# Altium footprint library hphonglib.PcbLib: 1250 footprints (part 42 of 79)
Each footprint in its own frame and in the unit in brackets; x right, y up, seen from the top. Pads: shape width x height; smd on the part's side, far side on the other; paste and mask are expansions set on the pad; w line width, h text height; cw(c..) or ccw(c..) is an arc to the next point about the centre after c.
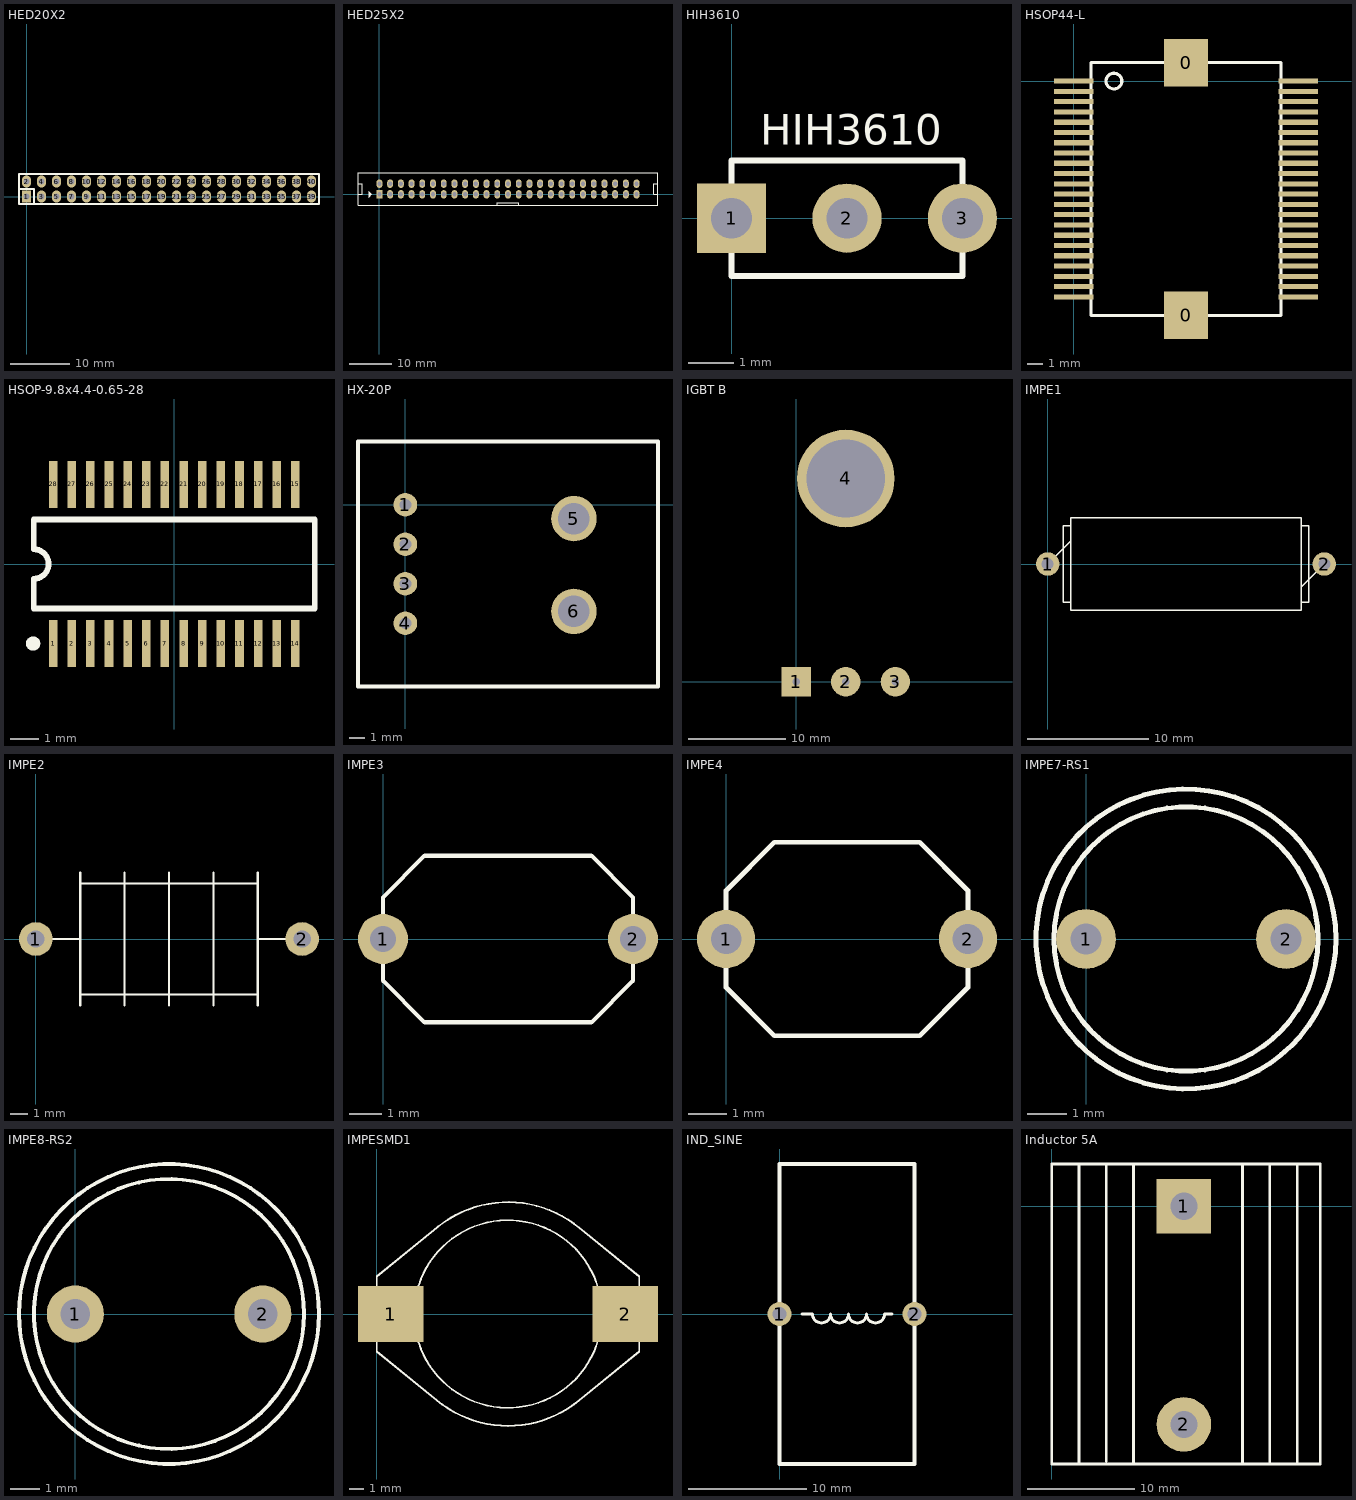
[diagram p41: the footprints below, top view; thin cyan lines are the x and y axes]

## HED20X2 [mm]
pads (40):
  rect 1.6x2 hole 1: 1(0,0)
  oval 1.6x2 hole 1: 2(0,2.54) 3(2.54,0) 4(2.54,2.54) 5(5.08,0) 6(5.08,2.54) 7(7.62,0) 8(7.62,2.54) 9(10.16,0) 10(10.16,2.54) 11(12.7,0) 12(12.7,2.54) 13(15.24,0) 14(15.24,2.54) 15(17.78,0) 16(17.78,2.54) 17(20.32,0) 18(20.32,2.54) 19(22.86,0) 20(22.86,2.54) 21(25.4,0) 22(25.4,2.54) 23(27.94,0) 24(27.94,2.54) 25(30.48,0) 26(30.48,2.54) 27(33.02,0) 28(33.02,2.54) 29(35.56,0) 30(35.56,2.54) 31(38.1,0) 32(38.1,2.54) 33(40.64,0) 34(40.64,2.54) 35(43.18,0) 36(43.18,2.54) 37(45.72,0) 38(45.72,2.54) 39(48.26,0) 40(48.26,2.54)
Top Overlay:
  lines w0.305: -1.27,1.27 1.27,1.27 1.27,-1.27 ; -1.27,-1.27 -1.27,3.81 49.53,3.81 49.53,-1.27 -1.27,-1.27

## HED25X2 [mm]
pads (50):
  rect 1.4x2 hole 1: 1(0,0)
  oval 1.4x2 hole 1: 2(0,2.54) 3(2.54,0) 4(2.54,2.54) 5(5.08,0) 6(5.08,2.54) 7(7.62,0) 8(7.62,2.54) 9(10.16,0) 10(10.16,2.54) 11(12.7,0) 12(12.7,2.54) 13(15.24,0) 14(15.24,2.54) 15(17.78,0) 16(17.78,2.54) 17(20.32,0) 18(20.32,2.54) 19(22.86,0) 20(22.86,2.54) 21(25.4,0) 22(25.4,2.54) 23(27.94,0) 24(27.94,2.54) 25(30.48,0) 26(30.48,2.54) 27(33.02,0) 28(33.02,2.54) 29(35.56,0) 30(35.56,2.54) 31(38.1,0) 32(38.1,2.54) 33(40.64,0) 34(40.64,2.54) 35(43.18,0) 36(43.18,2.54) 37(45.72,0) 38(45.72,2.54) 39(48.26,0) 40(48.26,2.54) 41(50.8,0) 42(50.8,2.54) 43(53.34,0) 44(53.34,2.54) 45(55.88,0) 46(55.88,2.54) 47(58.42,0) 48(58.42,2.54) 49(60.96,0) 50(60.96,2.54)
Top Overlay:
  region: -2.565,0.749 -2.565,-0.8 -1.778,-0.013
  lines w0.203: -5.055,0.025 -4.089,0.025 -4.089,2.54 -5.055,2.54 ; 27.915,-2.489 27.915,-2.032 33.02,-2.032 33.045,-2.007 33.045,-2.54 ; 66.015,5.08 -5.08,5.08 -5.08,-2.54 66.04,-2.54 66.04,-2.515 66.04,5.08 ; 66.04,0.025 65.075,0.025 65.075,2.54 66.04,2.54

## HIH3610 [mil]
pads (3):
  rect 60x60 hole 35.43: 1(0,0)
  round 60 hole 35.43: 2(100,0) 3(200,0)
Top Overlay:
  lines w5: 0,-50 200,-50 200,50 0,50 0,-50
  text "HIH3610" at 25,55 h45.6

## HSOP44-L [mm]
pads (46):
  rect 2.8x3 smd: 0(7.1,-14.815) 0(7.1,1.162)
  rect 2.5x0.325 smd: 1(0,0) 2(0,-0.65) 3(0,-1.3) 4(0,-1.95) 5(0,-2.6) 6(0,-3.25) 7(0,-3.9) 8(0,-4.55) 9(0,-5.2) 10(0,-5.85) 11(0,-6.5) 12(0,-7.15) 13(0,-7.8) 14(0,-8.45) 15(0,-9.1) 16(0,-9.75) 17(0,-10.4) 18(0,-11.05) 19(0,-11.7) 20(0,-12.35) 21(0,-13) 22(0,-13.65) 23(14.2,-13.65) 24(14.2,-13) 25(14.2,-12.35) 26(14.2,-11.7) 27(14.2,-11.05) 28(14.2,-10.4) 29(14.2,-9.75) 30(14.2,-9.1) 31(14.2,-8.45) 32(14.2,-7.8) 33(14.2,-7.15) 34(14.2,-6.5) 35(14.2,-5.85) 36(14.2,-5.2) 37(14.2,-4.55) 38(14.2,-3.9) 39(14.2,-3.25) 40(14.2,-2.6) 41(14.2,-1.95) 42(14.2,-1.3) 43(14.2,-0.65) 44(14.2,0)
Top Overlay:
  circle w0.2: c2.54,0 r0.5
  lines w0.2: 1.1,-14.825 1.1,1.175 13.1,1.175 13.1,-14.825 1.1,-14.825

## HSOP-9.8x4.4-0.65-28 [mm] "Small Outline Pakage; 28 Leads; Body 4.4 mm; Pitch 0.65 mm; Heatsink"
height 1.2
pads (28):
  rect 0.3x1.65 smd: 1(-4.225,-2.775) 2(-3.575,-2.775) 3(-2.925,-2.775) 4(-2.275,-2.775) 5(-1.625,-2.775) 6(-0.975,-2.775) 7(-0.325,-2.775) 8(0.325,-2.775) 9(0.975,-2.775) 10(1.625,-2.775) 11(2.275,-2.775) 12(2.925,-2.775) 13(3.575,-2.775) 14(4.225,-2.775) 15(4.225,2.775) 16(3.575,2.775) 17(2.925,2.775) 18(2.275,2.775) 19(1.625,2.775) 20(0.975,2.775) 21(0.325,2.775) 22(-0.325,2.775) 23(-0.975,2.775) 24(-1.625,2.775) 25(-2.275,2.775) 26(-2.925,2.775) 27(-3.575,2.775) 28(-4.225,2.775)
Top Overlay:
  circle w0.25: c-4.925,-2.775 r0.125
  lines w0.2: -4.9,-1.55 -4.9,-0.517 ccw(c-4.9,0) -4.9,0.517 -4.9,1.55 4.9,1.55 4.9,-1.55 -4.9,-1.55
3D body "User Library-IPC SO.step": height 1.35, standoff 0, extent -4.9,-3.228 4.9,3.228

## HX-20P [mil] "Current Transducer HX Series; 3-25A"
pads (6):
  round 60 hole 30: 1(0,0) 2(0,-100) 3(0,-200) 4(0,-300)
  round 115 hole 80: 5(427,-35) 6(427,-270)
Top Overlay:
  lines w10: -120,-460 -120,160 640,160 640,-460 -120,-460
3D body "CUI-DEFAULT (2).step": height 473.44, standoff -195.85, extent -86.96,-464.96 542.96,164.96

## IGBT B [mm] "GT60N321"
pads (4):
  rect 3x3 hole 0.762: 1(0,0)
  round 3 hole 0.762: 2(5.08,0) 3(10.16,0)
  round 10 hole 8: 4(5.08,20.828)
Bottom Overlay:
  lines w0.2: -5.842,-3.302 16.256,-3.302 16.256,27.432 -5.842,27.432 -5.842,-3.302
  text "IGBT" at 0,8.636 h3
3D body "TO 247.step": height 1.1, standoff -10.9, extent -2.616,-0.508 13.284,26.474
3D body: height 0, standoff 0, extent 16.61,-3.402 16.61,-3.402

## IMPE1 [mil] "Body 23x10 mm Horiz. - 900 mils"
pads (2):
  round 76 hole 39.37: 1(0,0) 2(900,0)
Top Overlay:
  lines w5: 0,0 75,75 ; 75,-125 50,-125 50,125 75,125 ; 825,-125 850,-125 850,125 825,125 ; 825,-75 900,0 ; 75,-150 75,150 825,150 825,-150 75,-150

## IMPE2 [mil] "Body 10x7.5 mm Horiz. - 600 mils"
pads (2):
  round 76 hole 39.37: 1(0,0) 2(600,0)
Top Overlay:
  lines w5: 0,0 100,0 ; 100,-150 100,150 ; 100,-125 500,-125 ; 100,125 500,125 ; 200,-150 200,150 ; 300,-150 300,150 ; 400,-150 400,150 ; 500,-150 500,150 ; 500,0 575,0

## IMPE3 [mil] "Body 7.6x4.9 mm Radial - 300 mils"
pads (2):
  round 60 hole 31.49 unplated: 1(0,0) 2(300,0)
Top Overlay:
  lines w5: 0,-50 0,50 50,100 250,100 300,50 300,-50 250,-100 50,-100 0,-50

## IMPE4 [mil] "Body 7.6x5.5 mm Radial - 250 mils"
pads (2):
  round 60 hole 31.49: 1(0,0) 2(250,0)
Top Overlay:
  lines w5: 0,-50 50,-100 200,-100 250,-50 250,50 200,100 50,100 0,50 0,-50

## IMPE7-RS1 [mil] "Body round radial diam 7.5mm - hight 9.5mm"
pads (2):
  round 60 hole 31.49: 1(0,0) 2(200,0)
Top Overlay:
  circle w5: c100,0 r150
  circle w5: c100,0 r132.1
3D body "inductor SDR0805.STEP": height 208.66, standoff 0, extent -52,-156 255.09,151.09

## IMPE8-RS2 [mil] "Body round radial diam 10mm - hight 18mm"
pads (2):
  round 76 hole 39.37: 1(0,0) 2(250,0)
Top Overlay:
  circle w5: c125,0 r200
  circle w5: c125,0 r180
3D body "inductor SDR0805.STEP": height 208.66, standoff 0, extent -28.54,-152 278.54,155.09

## IMPESMD1 [mil]
pads (2):
  rect 175x150 smd: 1(37.5,0) 2(662.5,0)
Top Overlay:
  circle w5: c350,0 r250.19
  lines w5: 150.38,221.7 cw(c350,0) 540.16,229.87 ; 160,-230 0,-100 0,100 160,230 ; 160.24,-230.2 ccw(c350,0) 540.16,-229.87 ; 540,-230 700,-100 700,100 540,230
3D body "WE-PD4-1.STEP": height 110, standoff 0, extent 206,-90 466,90

## IND_SINE [mil]
pads (2):
  round 80 hole 47.24: 1(0,0) 2(450,0)
Top Overlay:
  lines w10: 75,0 110,0 ccw(c140,0) 170,0 ccw(c200,0) 230,0 ccw(c260,0) 290,0 ccw(c320,0) 350,0 375,0
  lines w12: 0,-500 450,-500 450,500 0,500 0,0 0,-500

## Inductor 5A [mil] "Inductor 5A; Solder Pad 35mil"
pads (2):
  rect 200x200 hole 100: 1(485,0)
  round 200 hole 100: 2(485,-800)
Top Overlay:
  lines w10: 100,-945 100,155 ; 200,-935 200,155 ; 300,-945 300,155 ; 700,-945 700,155 ; 800,-940 800,155 ; 900,-945 900,155 ; 0,-945 985,-945 985,155 0,155 0,-945